# Altium footprint library MCBoard_pcb.PcbLib: 78 footprints (part 2 of 5)
Each footprint in its own frame and in the unit in brackets; x right, y up, seen from the top. Pads: shape width x height; smd on the part's side, far side on the other; paste and mask are expansions set on the pad; w line width, h text height; cw(c..) or ccw(c..) is an arc to the next point about the centre after c.
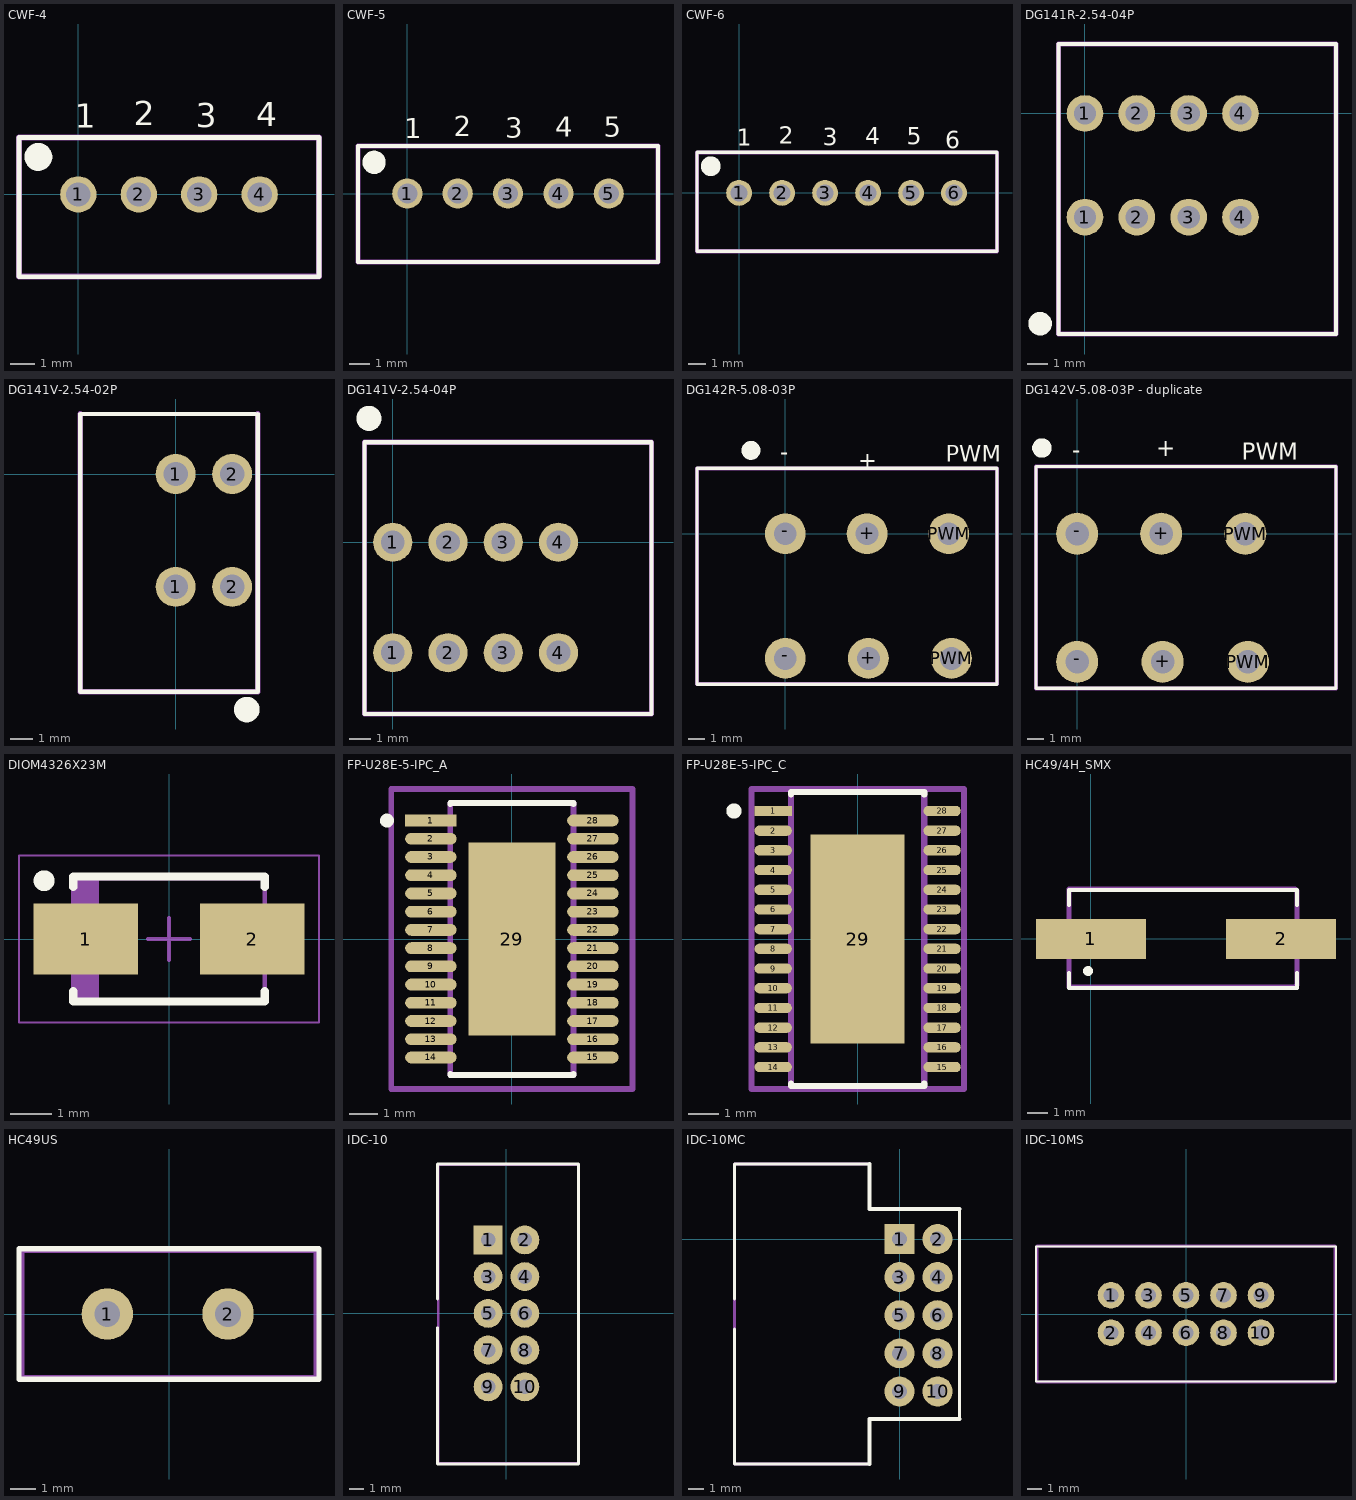
[diagram p1: the footprints below, top view; thin cyan lines are the x and y axes]

## CWF-4 [mm]
pads (4):
  round 1.5 hole 1: 1(0,0) 2(2.5,0) 3(5,0) 4(7.5,0)
Top Overlay:
  circle w0.75: c-1.65,1.55 r0.2
  lines w0.2: -2.45,-3.4 -2.45,2.35 9.95,2.35 9.95,0 9.95,-3.4 -2.45,-3.4
  text "1" at -0.15,2.75 h1
  text "2" at 2.3,2.85 h1
  text "3" at 4.85,2.775 h1
  text "4" at 7.35,2.825 h1
Top Solder:
  lines w0.1: 6.35,-0.75 6.375,-0.75 6.875,-1.25 8,-1.25 8.187,-1.062 8.563,-0.687 ; 6.375,0.775 6.875,1.275 8.1,1.275 8.75,0.625 8.75,-0.5 8.563,-0.687 ; 8.563,-0.687 8.563,-0.687
Pattern top:
  lines w0.25: -2.45,-3.4 9.95,-3.4 9.95,0 9.95,2.35 -2.45,2.35 -2.45,-3.4
  text ".Designator" at 0,-2.4 h2.13
3D body "cwf-4.STEP": height 7, standoff -3.4, extent -2.4,-3.475 10,2.275

## CWF-5 [mm]
pads (5):
  round 1.5 hole 1: 1(0,0) 2(2.5,0) 3(5,0) 4(7.5,0) 5(10,0)
Top Overlay:
  circle w0.75: c-1.65,1.55 r0.2
  lines w0.2: -2.45,-3.4 -2.45,2.35 9.95,2.35 12.446,2.35 12.446,-3.4 -2.45,-3.4
  text "1" at -0.15,2.75 h1
  text "2" at 2.3,2.85 h1
  text "3" at 4.85,2.775 h1
  text "4" at 7.35,2.825 h1
  text "5" at 9.754,2.819 h1
Pattern top:
  lines w0.25: -2.45,-3.4 12.446,-3.4 12.446,2.35 9.95,2.35 -2.45,2.35 -2.45,-3.4
  text ".Designator" at 0.7,-2 h2.13
3D body "cwf-5.STEP": height 7, standoff -2.35, extent -2.55,-3.375 12.35,2.375

## CWF-6 [mm]
pads (6):
  round 1.5 hole 1: 1(0,0) 2(2.5,0) 3(5,0) 4(7.5,0) 5(10,0) 6(12.5,0)
Top Overlay:
  circle w0.75: c-1.65,1.55 r0.2
  lines w0.2: -2.45,-3.4 15,-3.4 15,2.35 9.95,2.35 -2.45,2.35 -2.45,-3.4
  text "5" at 9.754,2.819 h1
  text "4" at 7.35,2.825 h1
  text "3" at 4.85,2.775 h1
  text "2" at 2.3,2.85 h1
  text "1" at -0.15,2.75 h1
  text "6" at 12,2.6 h1
Pattern top:
  lines w0.25: -2.45,-3.4 -2.45,2.35 9.95,2.35 15,2.35 15,-3.4 -2.45,-3.4
  text ".Designator" at 0.7,-2 h2.13
3D body "vilka_na_platu_6pin_2_5mm.step": height 7, standoff -3.4, extent -2.4,-3.45 15,2.3

## DG141R-2.54-04P [mm]
pads (8):
  round 1.8 hole 1.1: 1(0,-5.08) 1(0,0) 2(2.54,-5.08) 2(2.54,0) 3(5.08,-5.08) 3(5.08,0) 4(7.62,-5.08) 4(7.62,0)
Top Overlay:
  circle w0.75: c-2.2,-10.3 r0.2
  lines w0.2: -1.3,-10.8 12.3,-10.8 12.3,3.4 6.5,3.4 -1.3,3.4 -1.3,-10.8
Pattern top:
  lines w0.25: -1.3,-10.8 -1.3,3.4 6.5,3.4 12.3,3.4 12.3,-10.8 -1.3,-10.8
  text ".Designator" at 0.7,-2 h2.13
3D body "User Library-DG141R-4-2_54.step": height 12.6, standoff -3.5, extent -0.8,-10.5 11.8,3.1

## DG141V-2.54-02P [mm]
pads (4):
  round 1.8 hole 1.1: 1(0,-5.08) 1(0,0) 2(2.54,-5.08) 2(2.54,0)
Top Overlay:
  circle w0.75: c3.2,-10.6 r0.2
  lines w0.2: 3.6,2.7 -4.3,2.7 -4.3,-9.8 3.7,-9.8 3.7,2.7
Pattern top:
  lines w0.25: -4.3,2.7 -4.3,-9.8 3.7,-9.8 3.7,2.7
  text ".Designator" at -1.7,-7.7 h2.13
3D body "DG141V-2-2.54.STEP": height 3.5, standoff -13.6, extent -4.3,-9.8 3.22,2.8

## DG141V-2.54-04P [mm]
pads (8):
  round 1.8 hole 1.1: 1(0,-5.08) 1(0,0) 2(2.54,-5.08) 2(2.54,0) 3(5.08,-5.08) 3(5.08,0) 4(7.62,-5.08) 4(7.62,0)
Top Overlay:
  circle w0.75: c-1.1,5.7 r0.2
  lines w0.2: -1.3,-7.9 -1.3,4.6 7.7,4.6 11.9,4.6 11.9,-7.9 -1.3,-7.9
Pattern top:
  lines w0.25: -1.3,-7.9 11.9,-7.9 11.9,4.6 7.7,4.6 -1.3,4.6 -1.3,-7.9
  text ".Designator" at 0.7,-2 h2.13
3D body "DG141V-4-2.54 (1).STEP": height 13.6, standoff -3.5, extent -0.699,-7.934 11.901,4.666

## DG142R-5.08-03P [mm]
pads (6):
  round 2.5 hole 1.4: +(5,0) +(5.08,-7.62) -(0,-7.62) -(0,0) PWM(10,0) PWM(10.16,-7.62)
Top Overlay:
  circle w0.75: c-2.1,5.1 r0.2
  lines w0.2: -5.4,-9.2 -5.4,4 8.3,4 12.95,4 12.95,-9.2 -5.4,-9.2
  text "+" at 4.453,4 h1
  text "PWM" at 9.8,4.4 h1
  text "-" at -0.3,4.5 h1
Pattern top:
  lines w0.25: -5.4,-9.2 12.95,-9.2 12.95,4 8.3,4 -5.4,4 -5.4,-9.2
  text ".Designator" at 2.7,-2.5 h2.13
3D body "User Library-KF142R-5_08-MultiConfig.step": height 13.4, standoff -3.5, extent -5,-9.45 12.68,4.65

## DG142V-5.08-03P - duplicate [mm]
pads (6):
  round 2.5 hole 1.4: +(5,0) +(5.08,-7.62) -(0,-7.62) -(0,0) PWM(10,0) PWM(10.16,-7.62)
Top Overlay:
  circle w0.75: c-2.1,5.1 r0.2
  lines w0.2: -2.45,-9.2 15.4,-9.2 15.4,4 8.3,4 -2.45,4 -2.45,-9.2
  text "PWM" at 9.8,4.4 h1
  text "+" at 4.7,4.6 h1
  text "-" at -0.3,4.5 h1
Pattern top:
  lines w0.25: -2.45,-9.2 -2.45,4 8.3,4 15.4,4 15.4,-9.2 -2.45,-9.2
  text ".Designator" at 0.7,-2 h2.13
3D body "DG142V-3-5.08.STEP": height 14.1, standoff -3.5, extent -2.44,-9.2 15.24,4

## DIOM4326X23M [mm] "Molded Diode, 2-Leads, Body 4,30x2,61mm, IPC Low Density"
height 2.3
pads (2):
  rect 2.5x1.7 smd: 1(-2,0) 2(2,0)
Top Overlay:
  circle w0.25: c-3,1.4 r0.125
  lines w0.2: -2.3,-1.25 -2.3,-1.5 2.3,-1.5 2.3,-1.25 ; -2.3,1.25 -2.3,1.5 2.3,1.5 2.3,1.25
Mechanical 13:
  rectangle: -2.3,-1.46 -1.681,1.46
  lines w0.1: -2.3,-1.46 -2.3,1.46 2.3,1.46 2.3,-1.46 -2.3,-1.46
Mechanical 15:
  lines w0.05: -3.6,-2 -3.6,2 3.6,2 3.6,-2 -3.6,-2
  lines w0.1: -0.5,0 0.5,0 ; 0,-0.5 0,0.5
3D body: height 2.3, standoff 0, extent -2.3,-1.46 2.3,1.46

## FP-U28E-5-IPC_A [mm]
pads (29):
  rect 1.833x0.421 smd paste+0 mask+0: 1(-2.888,4.225)
  rrect100% 1.833x0.421 smd paste+0 mask+0: 2(-2.888,3.575) 3(-2.888,2.925) 4(-2.888,2.275) 5(-2.888,1.625) 6(-2.888,0.975) 7(-2.888,0.325) 8(-2.888,-0.325) 9(-2.888,-0.975) 10(-2.888,-1.625) 11(-2.888,-2.275) 12(-2.888,-2.925) 13(-2.888,-3.575) 14(-2.888,-4.225) 15(2.888,-4.225) 16(2.888,-3.575) 17(2.888,-2.925) 18(2.888,-2.275) 19(2.888,-1.625) 20(2.888,-0.975) 21(2.888,-0.325) 22(2.888,0.325) 23(2.888,0.975) 24(2.888,1.625) 25(2.888,2.275) 26(2.888,2.925) 27(2.888,3.575) 28(2.888,4.225)
  rect 3.1x6.9 smd paste-1000 mask+0: 29(0,0)
Top Overlay:
  circle w0.25: c-4.455,4.225 r0.125
  lines w0.2: -2.2,-4.81 -2.2,-4.85 2.2,-4.85 2.2,-4.81 ; -2.2,4.81 -2.2,4.85 2.2,4.85 2.2,4.81
Top Paste:
  rectangle: -1.007,-2.907 1.007,-0.271
  rectangle: -1.007,0.271 1.007,2.907
Top 3D Body:
  lines w0.2: -2.2,-4.85 -2.2,4.85 2.2,4.85 2.2,-4.85 -2.2,-4.85
Top Assembly:
  lines w0.2: -4.305,-5.35 -4.305,5.35 4.305,5.35 4.305,-5.35 -4.305,-5.35
  text ".Designator" at 0,0.188 h1
Top Courtyard:
  lines w0.2: -4.305,-5.35 -4.305,5.35 4.305,5.35 4.305,-5.35 -4.305,-5.35
Top Component Center:
  lines w0.1: -0.5,0 0.5,0 ; 0,-0.5 0,0.5
3D body "IC_Maxim_Integrated_MAX7456EUI+T_eec.STEP": height 0.25, standoff 0, extent -4.305,-5.35 4.305,5.35

## FP-U28E-5-IPC_C [mm]
pads (29):
  rect 1.233x0.341 smd paste+0 mask+0: 1(-2.788,4.225)
  rrect100% 1.233x0.341 smd paste+0 mask+0: 2(-2.788,3.575) 3(-2.788,2.925) 4(-2.788,2.275) 5(-2.788,1.625) 6(-2.788,0.975) 7(-2.788,0.325) 8(-2.788,-0.325) 9(-2.788,-0.975) 10(-2.788,-1.625) 11(-2.788,-2.275) 12(-2.788,-2.925) 13(-2.788,-3.575) 14(-2.788,-4.225) 15(2.788,-4.225) 16(2.788,-3.575) 17(2.788,-2.925) 18(2.788,-2.275) 19(2.788,-1.625) 20(2.788,-0.975) 21(2.788,-0.325) 22(2.788,0.325) 23(2.788,0.975) 24(2.788,1.625) 25(2.788,2.275) 26(2.788,2.925) 27(2.788,3.575) 28(2.788,4.225)
  rect 3.1x6.9 smd paste-1000 mask+0: 29(0,0)
Top Overlay:
  circle w0.25: c-4.08,4.225 r0.125
  lines w0.2: -2.2,-4.77 -2.2,-4.85 2.2,-4.85 2.2,-4.77 ; -2.2,4.77 -2.2,4.85 2.2,4.85 2.2,4.77
Top Paste:
  rectangle: -1.007,0.271 1.007,2.907
  rectangle: -1.007,-2.907 1.007,-0.271
Top 3D Body:
  lines w0.2: -2.2,-4.85 2.2,-4.85 2.2,4.85 -2.2,4.85 -2.2,-4.85
Top Assembly:
  lines w0.2: -3.505,-4.95 3.505,-4.95 3.505,4.95 -3.505,4.95 -3.505,-4.95
  text ".Designator" at 0,0.188 h1
Top Courtyard:
  lines w0.2: -3.505,-4.95 3.505,-4.95 3.505,4.95 -3.505,4.95 -3.505,-4.95
Top Component Center:
  lines w0.1: -0.5,0 0.5,0 ; 0,-0.5 0,0.5
3D body "IC_Maxim_Integrated_MAX7456EUI+T_eec.STEP": height 0.25, standoff 0, extent -3.505,-4.95 3.505,4.95

## HC49/4H_SMX [mm] "Surface Mount Quartz Crystal; Body 13.4 (inc. leads) x 4.9 mm (LxW max)"
height 4.3
pads (2):
  rect 5.5x2 smd: 1(0,0) 2(9.5,0)
Top Overlay:
  circle w0.25: c-0.15,-1.6 r0.125
  lines w0.2: -1.1,-1.7 -1.1,-2.45 10.3,-2.45 10.3,-1.7 ; -1.1,1.7 -1.1,2.45 10.3,2.45 10.3,1.7
Pattern top:
  lines w0.25: -1.1,-2.4 -1.1,2.5 10.2,2.5 10.3,2.4 10.3,-2.3 10.2,-2.4 -1.1,-2.4
  text ".Designator" at 4.5,7.503 h2.13
3D body "HC-49SM.stp": height 4, standoff 0, extent -2.2,-2.4 11.2,2.4

## HC49US [mm]
pads (2):
  round 2 hole 1: 1(-2.4,0) 2(2.3,0)
Top Overlay:
  lines w0.2: -5.842,-2.54 5.842,-2.54 5.842,2.54 -5.842,2.54 -5.842,-2.54
Pattern top:
  text ".Designator" at -4.1,3.5 h2.13
Pattern bot:
  lines w0.25: 5,-2.5 -5,-2.5 ; -5,-2.5 5.75,-2.5 5.75,2.5 5,2.5 -5,2.5 -5.75,2.5 -5.75,-2.5 -5,-2.5
3D body "XTAL-HP49US.STEP": height 3.5, standoff -3, extent -5.675,-2.25 5.675,2.4

## IDC-10 [mm] "IDC-10 Male Connector"
height 9
pads (10):
  rect 2x2 hole 1: 1(-1.25,5.075)
  round 2 hole 1: 2(1.29,5.075) 3(-1.25,2.535) 4(1.29,2.535) 5(-1.25,-0.005) 6(1.29,-0.005) 7(-1.25,-2.545) 8(1.29,-2.545) 9(-1.25,-5.085) 10(1.29,-5.085)
Top Overlay:
  lines w0.2: -4.75,-1 -4.75,-10.425 5,-10.425 5,10.325 -4.75,10.325 -4.75,1
Pattern top:
  lines w0.2: -4.7,-10.4 5,-10.4 5,10.3 -4.7,10.3 -4.7,-10.4
  text ".Designator" at -4.3,7.4 h2.13
3D body "User Library-BH-10__64BH-10.STEP": height 9.1, standoff -3, extent -4.53,-10.305 4.77,10.195

## IDC-10MC [mm] "IDC-14 Male Connector"
height 9
pads (10):
  rect 2x2 hole 1: 1(0,0)
  round 2 hole 1: 2(2.54,0) 3(0,-2.54) 4(2.54,-2.54) 5(0,-5.08) 6(2.54,-5.08) 7(0,-7.62) 8(2.54,-7.62) 9(0,-10.16) 10(2.54,-10.16)
Top Layer:
  lines w0.254: -0.254,0 0.254,0 ; 0,-0.254 0,0.254
Top Overlay:
  lines w0.2: -11,-6 -11,-15 -2,-15 ; -11,-4 -11,5 -2,5 ; 4,-12 4,2
  lines w0.254: -2,-15 -2,-12 4,-12 ; -2,5 -2,2 4,2
Template:
  lines w0.2: -11,-15 -2,-15 ; -11,5 -2,5
Pattern top:
  lines w0.2: -11,-15 -11,4.9 -10.9,5 -2,5 -2,2 4,2 4,-12 -2,-12 -2,-15 -11,-15
  text ".Designator" at -11,2.6 h2.13
3D body "IDC Male 10pin Angled 2_54mm.STEP": height 8.98, standoff -2.37, extent -10.735,-15.57 2.825,5.37

## IDC-10MS [mm]
pads (10):
  round 1.8 hole 1: 1(-5.08,1.27) 2(-5.08,-1.27) 3(-2.54,1.27) 4(-2.54,-1.27) 5(0,1.27) 6(0,-1.27) 7(2.54,1.27) 8(2.54,-1.27) 9(5.08,1.27) 10(5.08,-1.27)
Top Overlay:
  lines w0.15: -10.16,-4.572 -10.16,4.572 10.16,4.572 10.16,-4.572 -10.16,-4.572
Pattern top:
  lines w0.2: -10.1,-4.6 -10.1,4.6 10.1,4.6 10.1,-4.6 -10.1,-4.6
  text ".Designator" at -4.7,2.8 h2.13
3D body "User Library-BH-10__64BH-10.STEP": height 9.1, standoff -3, extent -10.25,-4.75 10.25,4.55